# Altium footprint library F4AIR.PcbLib: 38 footprints (part 2 of 3)
Each footprint in its own frame and in the unit in brackets; x right, y up, seen from the top. Pads: shape width x height; smd on the part's side, far side on the other; paste and mask are expansions set on the pad; w line width, h text height; cw(c..) or ccw(c..) is an arc to the next point about the centre after c.
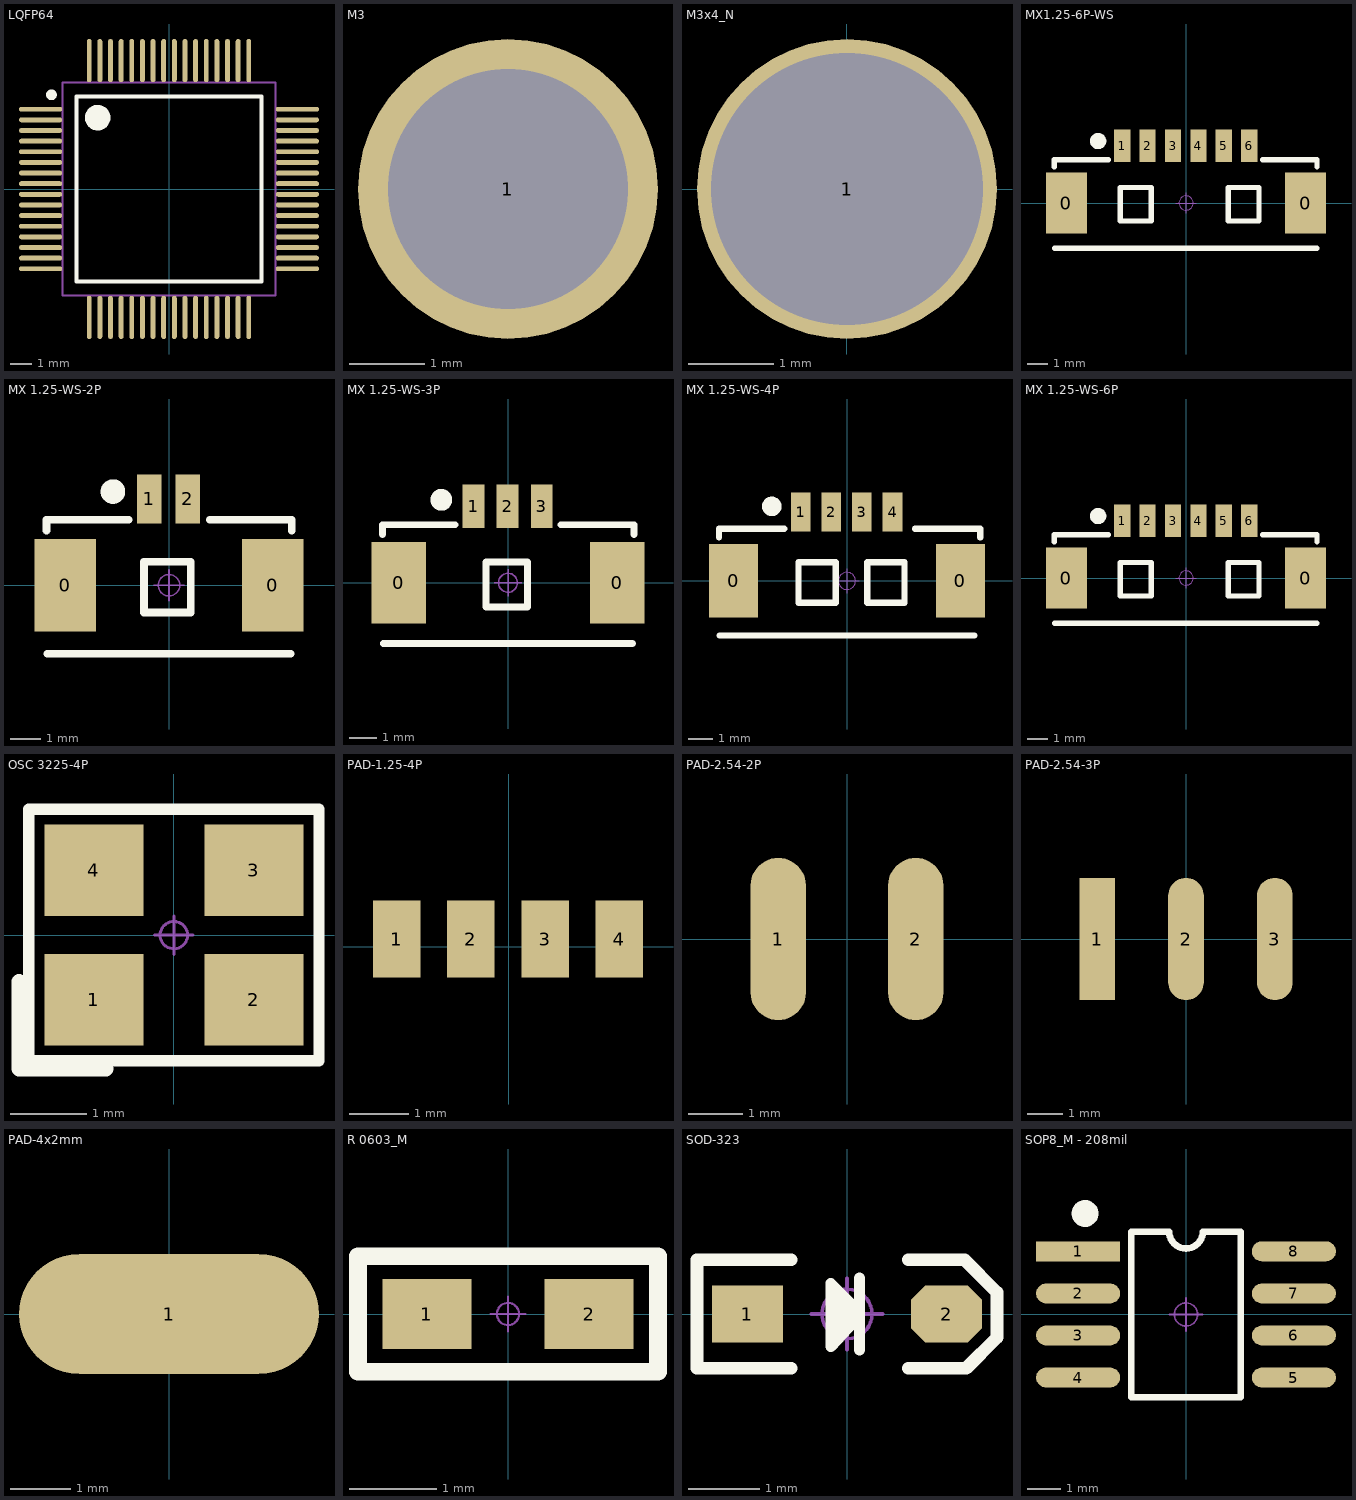
[diagram p1: the footprints below, top view; thin cyan lines are the x and y axes]

## LQFP64 [mil]
pads (64):
  oval 80x9 smd: 1(-237.52,147.64) 2(-237.52,127.95) 3(-237.52,108.27) 4(-237.52,88.58) 5(-237.52,68.9) 6(-237.52,49.21) 7(-237.52,29.53) 8(-237.52,9.84) 9(-237.52,-9.84) 10(-237.52,-29.53) 11(-237.52,-49.21) 12(-237.52,-68.9) 13(-237.52,-88.58) 14(-237.52,-108.27) 15(-237.52,-127.95) 16(-237.52,-147.64) 33(237.52,-147.64) 34(237.52,-127.95) 35(237.52,-108.27) 36(237.52,-88.58) 37(237.52,-68.9) 38(237.52,-49.21) 39(237.52,-29.53) 40(237.52,-9.84) 41(237.52,9.84) 42(237.52,29.53) 43(237.52,49.21) 44(237.52,68.9) 45(237.52,88.58) 46(237.52,108.27) 47(237.52,127.95) 48(237.52,147.64)
  oval 9x80 smd: 17(-147.64,-237.52) 18(-127.95,-237.52) 19(-108.27,-237.52) 20(-88.58,-237.52) 21(-68.9,-237.52) 22(-49.21,-237.52) 23(-29.53,-237.52) 24(-9.84,-237.52) 25(9.84,-237.52) 26(29.53,-237.52) 27(49.21,-237.52) 28(68.9,-237.52) 29(88.58,-237.52) 30(108.27,-237.52) 31(127.95,-237.52) 32(147.64,-237.52) 49(147.64,237.52) 50(127.95,237.52) 51(108.27,237.52) 52(88.58,237.52) 53(68.9,237.52) 54(49.21,237.52) 55(29.53,237.52) 56(9.84,237.52) 57(-9.84,237.52) 58(-29.53,237.52) 59(-49.21,237.52) 60(-68.9,237.52) 61(-88.58,237.52) 62(-108.27,237.52) 63(-127.95,237.52) 64(-147.64,237.52)
Top Overlay:
  circle w9.84: c-217.52,174.21 r4.92
  circle w23.62: c-131.89,131.89 r11.81
  lines w7.87: -171.26,-171.26 -171.26,171.26 171.26,171.26 171.26,-171.26 -171.26,-171.26
Mechanical 13:
  lines w3.94: -196.85,-196.85 -196.85,196.85 196.85,196.85 196.85,-196.85 -196.85,-196.85
3D body "LQFP-64.STEP": height 62.99, standoff 0.03, extent -236.22,-236.22 236.22,236.22

## M3 [mm]
pads (1):
  round 4 hole 3.2: 1(-104.755,37.485)

## M3x4_N [mm] "M3铜柱，长：4mm"
pads (1):
  round 3.5 hole 3.175: 1(0,0)

## MX1.25-6P-WS [mm]
pads (8):
  rect 2x3 smd: 0(-5.882,0) 0(5.882,0)
  rect 0.8x1.6 smd: 1(-3.139,2.811) 2(-1.889,2.811) 3(-0.639,2.811) 4(0.611,2.811) 5(1.861,2.811) 6(3.111,2.811)
Top Overlay:
  circle w0.4: c-4.324,3.048 r0.2
  lines w0.254: -6.483,1.778 -6.483,2.134 -3.816,2.134 ; -6.456,-2.228 6.451,-2.228 ; 3.778,2.134 6.445,2.134 6.445,1.778 ; -3.232,-0.889 -3.232,0.762 -1.708,0.762 -1.708,-0.889 -3.232,-0.889 ; 2.076,-0.889 2.076,0.762 3.6,0.762 3.6,-0.889 2.076,-0.889
Mechanical 15:
  circle w0.05: c0,0 r0.35
  lines w0.05: -0.5,0 0.5,0 ; 0,-0.5 0,0.5
3D body "MOLEX1.25-WS-6P.STEP": height 3.4, standoff 0, extent -6.325,-2.1 6.325,3.09

## MX 1.25-WS-2P [mm] "长：7.65mm，宽：4.2mm，高：3.4mm"
pads (4):
  rect 2x3 smd: 0(-3.382,0) 0(3.382,0)
  rect 0.8x1.6 smd: 1(-0.639,2.811) 2(0.611,2.811)
Top Overlay:
  circle w0.4: c-1.824,3.048 r0.2
  lines w0.254: -3.983,1.778 -3.983,2.134 -1.316,2.134 ; -3.956,-2.228 3.951,-2.228 ; 1.328,2.134 3.995,2.134 3.995,1.778 ; -0.814,-0.889 -0.814,0.762 0.71,0.762 0.71,-0.889 -0.814,-0.889
Mechanical 15:
  circle w0.05: c0,0 r0.35
  lines w0.05: -0.5,0 0.5,0 ; 0,-0.5 0,0.5
3D body "MOLEX1.25-WS-2P.STEP": height 3.4, standoff 0, extent -3.825,-2.1 3.825,3.09

## MX 1.25-WS-3P [mm] "长：8.9mm，宽：4.2mm，高：3.4mm"
pads (5):
  rect 2x3 smd: 0(-4.007,0) 0(4.007,0)
  rect 0.8x1.6 smd: 1(-1.264,2.811) 2(-0.014,2.811) 3(1.236,2.811)
Top Overlay:
  circle w0.4: c-2.449,3.048 r0.2
  lines w0.254: -4.608,1.778 -4.608,2.134 -1.941,2.134 ; -4.581,-2.228 4.576,-2.228 ; 1.953,2.134 4.62,2.134 4.62,1.778 ; -0.814,-0.889 -0.814,0.762 0.71,0.762 0.71,-0.889 -0.814,-0.889
Mechanical 15:
  circle w0.05: c0,0 r0.35
  lines w0.05: -0.5,0 0.5,0 ; 0,-0.5 0,0.5
3D body "MOLEX1.25-WS-3P.STEP": height 3.4, standoff 0, extent -4.45,-2.1 4.45,3.09

## MX 1.25-WS-4P [mm] "长：10.15mm，宽：4.2mm，高：3.4mm"
pads (6):
  rect 2x3 smd: 0(-4.632,0) 0(4.632,0)
  rect 0.8x1.6 smd: 1(-1.889,2.811) 2(-0.639,2.811) 3(0.611,2.811) 4(1.861,2.811)
Top Overlay:
  circle w0.4: c-3.074,3.048 r0.2
  lines w0.254: -5.233,1.778 -5.233,2.134 -2.566,2.134 ; -5.206,-2.228 5.201,-2.228 ; 2.782,2.134 5.449,2.134 5.449,1.778 ; -1.982,-0.889 -0.458,-0.889 -0.458,0.762 -1.982,0.762 -1.982,-0.889 ; 0.826,-0.889 2.35,-0.889 2.35,0.762 0.826,0.762 0.826,-0.889
Mechanical 15:
  circle w0.05: c0,0 r0.35
  lines w0.05: -0.5,0 0.5,0 ; 0,-0.5 0,0.5
3D body "MOLEX1.25-WS-4P.STEP": height 3.4, standoff 0, extent -5.075,-2.1 5.075,3.09

## MX 1.25-WS-6P [mm] "长：12.65mm，宽：4.2mm，高：3.4mm"
pads (8):
  rect 2x3 smd: 0(-5.882,0) 0(5.882,0)
  rect 0.8x1.6 smd: 1(-3.139,2.811) 2(-1.889,2.811) 3(-0.639,2.811) 4(0.611,2.811) 5(1.861,2.811) 6(3.111,2.811)
Top Overlay:
  circle w0.4: c-4.324,3.048 r0.2
  lines w0.254: -6.483,1.778 -6.483,2.134 -3.816,2.134 ; -6.456,-2.228 6.451,-2.228 ; 3.778,2.134 6.445,2.134 6.445,1.778 ; -3.232,-0.889 -1.708,-0.889 -1.708,0.762 -3.232,0.762 -3.232,-0.889 ; 2.076,-0.889 3.6,-0.889 3.6,0.762 2.076,0.762 2.076,-0.889
Mechanical 15:
  circle w0.05: c0,0 r0.35
  lines w0.05: -0.5,0 0.5,0 ; 0,-0.5 0,0.5
3D body "MOLEX1.25-WS-6P.STEP": height 3.4, standoff 0, extent -6.325,-2.1 6.325,3.09

## OSC 3225-4P [mm] "3.2*2.5*0.7mm(长宽高)"
pads (4):
  rect 1.3x1.2 smd: 1(-1.05,-0.85) 2(1.05,-0.85) 3(1.05,0.85) 4(-1.05,0.85)
Top Overlay:
  lines w0.15: -1.905,-1.651 -1.905,1.651 1.905,1.651 1.905,-1.651 -1.905,-1.651
  lines w0.2: -2.032,-1.753 -0.889,-1.753 ; -2.032,-1.727 -2.032,-0.61
Mechanical 15:
  circle w0.04: c0,0 r0.18
  lines w0.04: -0.254,0 0.254,0 ; 0,-0.254 0,0.254
3D body "OSC 3225-4.STEP": height 0.7, standoff -0.02, extent -1.6,-1.25 1.6,1.25

## PAD-1.25-4P [mm]
pads (4):
  rect 0.8x1.3 smd: 1(-1.889,0.134) 2(-0.639,0.134) 3(0.611,0.134) 4(1.861,0.134)

## PAD-2.54-2P [mm]
pads (2):
  oval 1.02x3 smd: 1(-1.27,0) 2(1.27,0)

## PAD-2.54-3P [mm]
pads (3):
  rect 1.02x3.5 smd: 1(-2.54,0)
  oval 1.02x3.5 smd: 2(0,0) 3(2.54,0)

## PAD-4x2mm [mm]
pads (1):
  oval 5x2 smd: 1(0,0)

## R 0603_M [mil] "1/10W贴片电阻"
pads (2):
  rect 40x31.5 smd: 1(-36.5,0) 2(36.5,0)
Top Overlay:
  lines w8: -67.5,-26 -67.5,26 67.5,26 67.5,-26 -67.5,-26
Mechanical 15:
  circle w1: c0,0 r5
  lines w1: -7.87,0 7.87,0 ; 0,-7.87 0,7.87
3D body "R 0603.STEP": height 15.79, standoff -0.13, extent -31.5,-15.75 31.5,15.75

## SOD-323 [mm] "1.8x1.3X0.9mm（长宽高，不包括引脚）"
pads (2):
  rect 1x0.8 smd: 1(-1.4,0)
  oct 1x0.8 smd: 2(1.4,0)
Top Overlay:
  lines w0.152: 0.178,-0.508 0.178,0.508 ; 0.178,-0.025 -0.229,-0.457 -0.229,0.432 0.178,0.025
  lines w0.178: -0.787,-0.762 -2.108,-0.762 -2.108,0.762 -0.787,0.762 ; 0.864,-0.762 1.676,-0.762 2.108,-0.33 2.108,0.305 1.651,0.762 0.864,0.762
  lines w0.254: -0.127,0.254 -0.152,-0.178 0.025,-0.025 -0.025,0.127
Mechanical 15:
  circle w0.05: c0,0 r0.35
  lines w0.05: -0.5,0 0.5,0 ; 0,-0.5 0,0.5
3D body "SOD-323.STEP": height 1, standoff 0.04, extent -1.337,-0.631 1.311,0.669

## SOP8_M - 208mil [mm]
height 1.75
pads (8):
  rect 2.54x0.6 smd: 1(-3.258,1.905)
  oval 2.54x0.6 smd: 2(-3.258,0.635) 3(-3.258,-0.635) 4(-3.258,-1.905) 5(3.258,-1.905) 6(3.258,-0.635) 7(3.258,0.635) 8(3.258,1.905)
Top Overlay:
  circle w0.5: c-3.048,3.048 r0.155
  lines w0.2: -1.651,2.5 -1.651,-2.5 1.651,-2.5 1.651,2.5
  lines w0.203: -1.651,2.5 -0.508,2.5 ccw(c0,2.5) 0,1.992 ccw(c0,2.5) 0.508,2.5 1.651,2.5
Mechanical 15:
  circle w0.05: c0,0 r0.35
  lines w0.05: -0.5,0 0.5,0 ; 0,-0.5 0,0.5
3D body "SOP8.STEP": height 1.9, standoff 0, extent -3.003,-2.5 3.003,2.5